# Altium schematic symbol library jlcpcb_2025_04_capacitors_extended_0805.schlib: 3281 symbols (part 14 of 18) (continued)
## GCM21BC71E475ME36L (continued)
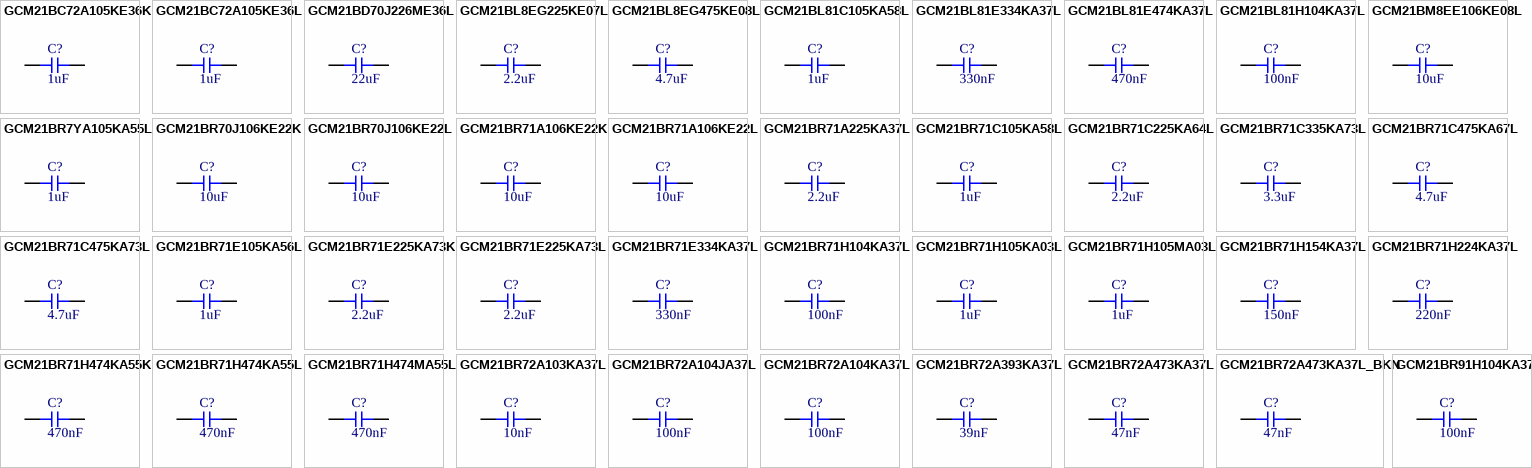
[diagram p62: symbols GCM21BC72A105KE36K to GCM21BR91H104KA37L]

## GCM21BC72A105KE36K
designator C?  Capacitance: 1uF  (hidden comment: *)
Capacitor, Ceramic (MLCC), 1uF, ±10%, 100V, X7S, ±10%, SMD 0805; Manufacturer: Murata Electronics; Manufacturer Part Number: GCM21BC72A105KE36K; Package Size: 0805; JLCPCB Basic Part: No; JLCPCB Part Number: C393696; Supplier 1: LCSC; Category: Capacitors - MLCC; Supplier Part Number 1: C393696; Tolerance: ±10%; Voltage Rating: 100V; Temperature Coefficient: X7S; RoHS: Yes; ComponentLink1Description: Datasheet; ComponentLink1URL: https://wmsc.lcsc.com/wmsc/upload/file/pdf/v2/lcsc/1912111437_Murata-Electronics-GCM21BC72A105KE36K_C393696.pdf; ComponentLink2Description: JLCPCB Part URL; ComponentLink2URL: https://jlcpcb.com/partdetail/C393696; ComponentLink3Description: LCSC Part URL; ComponentLink3URL: https://lcsc.com/product-detail/Multilayer-Ceramic-Capacitors-MLCC---SMD-SMT_Murata-Electronics-Murata-Electronics-GCM21BC72A105KE36K_C393696.html
footprint CAP-0805 (0805 (2012M) Capacitor)
pins: 1, 2

## GCM21BC72A105KE36L
designator C?  Capacitance: 1uF  (hidden comment: *)
Capacitor, Ceramic (MLCC), 1uF, ±10%, 100V, X7S, ±10%, SMD 0805; Manufacturer: Murata Electronics; Manufacturer Part Number: GCM21BC72A105KE36L; Package Size: 0805; JLCPCB Basic Part: No; JLCPCB Part Number: C126585; Supplier 1: LCSC; Category: Capacitors - MLCC; Supplier Part Number 1: C126585; Tolerance: ±10%; Voltage Rating: 100V; Temperature Coefficient: X7S; RoHS: Yes; ComponentLink1Description: Datasheet; ComponentLink1URL: https://wmsc.lcsc.com/wmsc/upload/file/pdf/v2/lcsc/1811141815_Murata-Electronics-GCM21BC72A105KE36L_C126585.pdf; ComponentLink2Description: JLCPCB Part URL; ComponentLink2URL: https://jlcpcb.com/partdetail/C126585; ComponentLink3Description: LCSC Part URL; ComponentLink3URL: https://lcsc.com/product-detail/Multilayer-Ceramic-Capacitors-MLCC---SMD-SMT_Murata-Electronics-Murata-Electronics-GCM21BC72A105KE36L_C126585.html
footprint CAP-0805 (0805 (2012M) Capacitor)
pins: 1, 2

## GCM21BD70J226ME36L
designator C?  Capacitance: 22uF  (hidden comment: *)
Capacitor, Ceramic (MLCC), 22uF, ±20%, 6.3V, X7T, ±20%, SMD 0805; Manufacturer: Murata Electronics; Manufacturer Part Number: GCM21BD70J226ME36L; Package Size: 0805; JLCPCB Basic Part: No; JLCPCB Part Number: C2981736; Supplier 1: LCSC; Category: Capacitors - MLCC; Supplier Part Number 1: C2981736; Tolerance: ±20%; Voltage Rating: 6.3V; Temperature Coefficient: X7T; RoHS: Yes; ComponentLink1Description: Datasheet; ComponentLink1URL: https://wmsc.lcsc.com/wmsc/upload/file/pdf/v2/lcsc/2203210916_Murata-Electronics-GCM21BD70J226ME36L_C2981736.pdf; ComponentLink2Description: JLCPCB Part URL; ComponentLink2URL: https://jlcpcb.com/partdetail/C2981736; ComponentLink3Description: LCSC Part URL; ComponentLink3URL: https://lcsc.com/product-detail/Multilayer-Ceramic-Capacitors-MLCC---SMD-SMT_Murata-Electronics-Murata-Electronics-GCM21BD70J226ME36L_C2981736.html
footprint CAP-0805 (0805 (2012M) Capacitor)
pins: 1, 2

## GCM21BL8EG225KE07L
designator C?  Capacitance: 2.2uF  (hidden comment: *)
Capacitor, Ceramic (MLCC), 2.2uF, ±10%, 35V, X8L, ±10%, SMD 0805; Manufacturer: Murata Electronics; Manufacturer Part Number: GCM21BL8EG225KE07L; Package Size: 0805; JLCPCB Basic Part: No; JLCPCB Part Number: C710702; Supplier 1: LCSC; Category: Capacitors - MLCC; Supplier Part Number 1: C710702; Tolerance: ±10%; Voltage Rating: 35V; Temperature Coefficient: X8L; RoHS: Yes; ComponentLink1Description: Datasheet; ComponentLink1URL: https://wmsc.lcsc.com/wmsc/upload/file/pdf/v2/lcsc/2308111608_Murata-Electronics-GCM21BL8EG225KE07L_C710702.pdf; ComponentLink2Description: JLCPCB Part URL; ComponentLink2URL: https://jlcpcb.com/partdetail/C710702; ComponentLink3Description: LCSC Part URL; ComponentLink3URL: https://lcsc.com/product-detail/Multilayer-Ceramic-Capacitors-MLCC---SMD-SMT_Murata-Electronics-Murata-Electronics-GCM21BL8EG225KE07L_C710702.html
footprint CAP-0805 (0805 (2012M) Capacitor)
pins: 1, 2

## GCM21BL8EG475KE08L
designator C?  Capacitance: 4.7uF  (hidden comment: *)
Capacitor, Ceramic (MLCC), 4.7uF, 35V, X8L, SMD 0805; Manufacturer: Murata Electronics; Manufacturer Part Number: GCM21BL8EG475KE08L; Package Size: 0805; JLCPCB Basic Part: No; JLCPCB Part Number: C2891526; Supplier 1: LCSC; Category: Capacitors - MLCC; Supplier Part Number 1: C2891526; Voltage Rating: 35V; Temperature Coefficient: X8L; RoHS: Yes; ComponentLink1Description: Datasheet; ComponentLink1URL: https://wmsc.lcsc.com/wmsc/upload/file/pdf/v2/lcsc/2201171800_Murata-Electronics-GCM21BL8EG475KE08L_C2891526.pdf; ComponentLink2Description: JLCPCB Part URL; ComponentLink2URL: https://jlcpcb.com/partdetail/C2891526; ComponentLink3Description: LCSC Part URL; ComponentLink3URL: https://lcsc.com/product-detail/Multilayer-Ceramic-Capacitors-MLCC---SMD-SMT_Murata-Electronics-Murata-Electronics-GCM21BL8EG475KE08L_C2891526.html
footprint CAP-0805 (0805 (2012M) Capacitor)
pins: 1, 2

## GCM21BL81C105KA58L
designator C?  Capacitance: 1uF  (hidden comment: *)
Capacitor, Ceramic (MLCC), 1uF, ±10%, 16V, X8L, ±10%, SMD 0805; Manufacturer: Murata Electronics; Manufacturer Part Number: GCM21BL81C105KA58L; Package Size: 0805; JLCPCB Basic Part: No; JLCPCB Part Number: C393690; Supplier 1: LCSC; Category: Capacitors - MLCC; Supplier Part Number 1: C393690; Tolerance: ±10%; Voltage Rating: 16V; Temperature Coefficient: X8L; RoHS: Yes; ComponentLink1Description: Datasheet; ComponentLink1URL: https://wmsc.lcsc.com/wmsc/upload/file/pdf/v2/lcsc/1912111437_Murata-Electronics-GCM21BL81C105KA58L_C393690.pdf; ComponentLink2Description: JLCPCB Part URL; ComponentLink2URL: https://jlcpcb.com/partdetail/C393690; ComponentLink3Description: LCSC Part URL; ComponentLink3URL: https://lcsc.com/product-detail/Multilayer-Ceramic-Capacitors-MLCC---SMD-SMT_Murata-Electronics-Murata-Electronics-GCM21BL81C105KA58L_C393690.html
footprint CAP-0805 (0805 (2012M) Capacitor)
pins: 1, 2

## GCM21BL81E334KA37L
designator C?  Capacitance: 330nF  (hidden comment: *)
Capacitor, Ceramic (MLCC), 330nF, ±10%, 25V, X8L, ±10%, SMD 0805; Manufacturer: Murata Electronics; Manufacturer Part Number: GCM21BL81E334KA37L; Package Size: 0805; JLCPCB Basic Part: No; JLCPCB Part Number: C161258; Supplier 1: LCSC; Category: Capacitors - MLCC; Supplier Part Number 1: C161258; Tolerance: ±10%; Voltage Rating: 25V; Temperature Coefficient: X8L; RoHS: Yes; ComponentLink1Description: Datasheet; ComponentLink1URL: https://wmsc.lcsc.com/wmsc/upload/file/pdf/v2/lcsc/1810201331_Murata-Electronics-GCM21BL81E334KA37L_C161258.pdf; ComponentLink2Description: JLCPCB Part URL; ComponentLink2URL: https://jlcpcb.com/partdetail/C161258; ComponentLink3Description: LCSC Part URL; ComponentLink3URL: https://lcsc.com/product-detail/Multilayer-Ceramic-Capacitors-MLCC---SMD-SMT_Murata-Electronics-Murata-Electronics-GCM21BL81E334KA37L_C161258.html
footprint CAP-0805 (0805 (2012M) Capacitor)
pins: 1, 2

## GCM21BL81E474KA37L
designator C?  Capacitance: 470nF  (hidden comment: *)
Capacitor, Ceramic (MLCC), 470nF, ±10%, 25V, X8L, ±10%, SMD 0805; Manufacturer: Murata Electronics; Manufacturer Part Number: GCM21BL81E474KA37L; Package Size: 0805; JLCPCB Basic Part: No; JLCPCB Part Number: C161259; Supplier 1: LCSC; Category: Capacitors - MLCC; Supplier Part Number 1: C161259; Tolerance: ±10%; Voltage Rating: 25V; Temperature Coefficient: X8L; RoHS: Yes; ComponentLink1Description: Datasheet; ComponentLink1URL: https://wmsc.lcsc.com/wmsc/upload/file/pdf/v2/lcsc/1810201331_Murata-Electronics-GCM21BL81E474KA37L_C161259.pdf; ComponentLink2Description: JLCPCB Part URL; ComponentLink2URL: https://jlcpcb.com/partdetail/C161259; ComponentLink3Description: LCSC Part URL; ComponentLink3URL: https://lcsc.com/product-detail/Multilayer-Ceramic-Capacitors-MLCC---SMD-SMT_Murata-Electronics-Murata-Electronics-GCM21BL81E474KA37L_C161259.html
footprint CAP-0805 (0805 (2012M) Capacitor)
pins: 1, 2

## GCM21BL81H104KA37L
designator C?  Capacitance: 100nF  (hidden comment: *)
Capacitor, Ceramic (MLCC), 100nF, ±10%, 50V, X8L, ±10%, SMD 0805; Manufacturer: Murata Electronics; Manufacturer Part Number: GCM21BL81H104KA37L; Package Size: 0805; JLCPCB Basic Part: No; JLCPCB Part Number: C710699; Supplier 1: LCSC; Category: Capacitors - MLCC; Supplier Part Number 1: C710699; Tolerance: ±10%; Voltage Rating: 50V; Temperature Coefficient: X8L; RoHS: Yes; ComponentLink1Description: Datasheet; ComponentLink1URL: https://wmsc.lcsc.com/wmsc/upload/file/pdf/v2/lcsc/2308111608_Murata-Electronics-GCM21BL81H104KA37L_C710699.pdf; ComponentLink2Description: JLCPCB Part URL; ComponentLink2URL: https://jlcpcb.com/partdetail/C710699; ComponentLink3Description: LCSC Part URL; ComponentLink3URL: https://lcsc.com/product-detail/Multilayer-Ceramic-Capacitors-MLCC---SMD-SMT_Murata-Electronics-Murata-Electronics-GCM21BL81H104KA37L_C710699.html
footprint CAP-0805 (0805 (2012M) Capacitor)
pins: 1, 2

## GCM21BM8EE106KE08L
designator C?  Capacitance: 10uF  (hidden comment: *)
Capacitor, Ceramic (MLCC), 10uF, 16V, X8M, SMD 0805; Manufacturer: Murata Electronics; Manufacturer Part Number: GCM21BM8EE106KE08L; Package Size: 0805; JLCPCB Basic Part: No; JLCPCB Part Number: C3838047; Supplier 1: LCSC; Category: Capacitors - MLCC; Supplier Part Number 1: C3838047; Voltage Rating: 16V; Temperature Coefficient: X8M; RoHS: Yes; ComponentLink1Description: Datasheet; ComponentLink1URL: https://wmsc.lcsc.com/wmsc/upload/file/pdf/v2/lcsc/2207272000_Murata-Electronics-GCM21BM8EE106KE08L_C3838047.pdf; ComponentLink2Description: JLCPCB Part URL; ComponentLink2URL: https://jlcpcb.com/partdetail/C3838047; ComponentLink3Description: LCSC Part URL; ComponentLink3URL: https://lcsc.com/product-detail/Multilayer-Ceramic-Capacitors-MLCC---SMD-SMT_Murata-Electronics-Murata-Electronics-GCM21BM8EE106KE08L_C3838047.html
footprint CAP-0805 (0805 (2012M) Capacitor)
pins: 1, 2

## GCM21BR7YA105KA55L
designator C?  Capacitance: 1uF  (hidden comment: *)
Capacitor, Ceramic (MLCC), 1uF, ±10%, 35V, X7R, ±10%, SMD 0805; Manufacturer: Murata Electronics; Manufacturer Part Number: GCM21BR7YA105KA55L; Package Size: 0805; JLCPCB Basic Part: No; JLCPCB Part Number: C161268; Supplier 1: LCSC; Category: Capacitors - MLCC; Supplier Part Number 1: C161268; Tolerance: ±10%; Voltage Rating: 35V; Temperature Coefficient: X7R; RoHS: Yes; ComponentLink1Description: Datasheet; ComponentLink1URL: https://wmsc.lcsc.com/wmsc/upload/file/pdf/v2/lcsc/1810201316_Murata-Electronics-GCM21BR7YA105KA55L_C161268.pdf; ComponentLink2Description: JLCPCB Part URL; ComponentLink2URL: https://jlcpcb.com/partdetail/C161268; ComponentLink3Description: LCSC Part URL; ComponentLink3URL: https://lcsc.com/product-detail/Multilayer-Ceramic-Capacitors-MLCC---SMD-SMT_Murata-Electronics-Murata-Electronics-GCM21BR7YA105KA55L_C161268.html
footprint CAP-0805 (0805 (2012M) Capacitor)
pins: 1, 2

## GCM21BR70J106KE22K
designator C?  Capacitance: 10uF  (hidden comment: *)
Capacitor, Ceramic (MLCC), 10uF, ±10%, 6.3V, X7R, ±10%, SMD 0805; Manufacturer: Murata Electronics; Manufacturer Part Number: GCM21BR70J106KE22K; Package Size: 0805; JLCPCB Basic Part: No; JLCPCB Part Number: C2167712; Supplier 1: LCSC; Category: Capacitors - MLCC; Supplier Part Number 1: C2167712; Tolerance: ±10%; Voltage Rating: 6.3V; Temperature Coefficient: X7R; RoHS: Yes; ComponentLink1Description: Datasheet; ComponentLink1URL: https://wmsc.lcsc.com/wmsc/upload/file/pdf/v2/lcsc/2202040230_Murata-Electronics-GCM21BR70J106KE22K_C2167712.pdf; ComponentLink2Description: JLCPCB Part URL; ComponentLink2URL: https://jlcpcb.com/partdetail/C2167712; ComponentLink3Description: LCSC Part URL; ComponentLink3URL: https://lcsc.com/product-detail/Multilayer-Ceramic-Capacitors-MLCC---SMD-SMT_Murata-Electronics-Murata-Electronics-GCM21BR70J106KE22K_C2167712.html
footprint CAP-0805 (0805 (2012M) Capacitor)
pins: 1, 2

## GCM21BR70J106KE22L
designator C?  Capacitance: 10uF  (hidden comment: *)
Capacitor, Ceramic (MLCC), 10uF, ±10%, 6.3V, X7R, ±10%, SMD 0805; Manufacturer: Murata Electronics; Manufacturer Part Number: GCM21BR70J106KE22L; Package Size: 0805; JLCPCB Basic Part: No; JLCPCB Part Number: C126230; Supplier 1: LCSC; Category: Capacitors - MLCC; Supplier Part Number 1: C126230; Tolerance: ±10%; Voltage Rating: 6.3V; Temperature Coefficient: X7R; RoHS: Yes; ComponentLink1Description: Datasheet; ComponentLink1URL: https://wmsc.lcsc.com/wmsc/upload/file/pdf/v2/lcsc/1810201231_Murata-Electronics-GCM21BR70J106KE22L_C126230.pdf; ComponentLink2Description: JLCPCB Part URL; ComponentLink2URL: https://jlcpcb.com/partdetail/C126230; ComponentLink3Description: LCSC Part URL; ComponentLink3URL: https://lcsc.com/product-detail/Multilayer-Ceramic-Capacitors-MLCC---SMD-SMT_Murata-Electronics-Murata-Electronics-GCM21BR70J106KE22L_C126230.html
footprint CAP-0805 (0805 (2012M) Capacitor)
pins: 1, 2

## GCM21BR71A106KE22K
designator C?  Capacitance: 10uF  (hidden comment: *)
Capacitor, Ceramic (MLCC), 10uF, ±10%, 10V, X7R, ±10%, SMD 0805; Manufacturer: Murata Electronics; Manufacturer Part Number: GCM21BR71A106KE22K; Package Size: 0805; JLCPCB Basic Part: No; JLCPCB Part Number: C2167756; Supplier 1: LCSC; Category: Capacitors - MLCC; Supplier Part Number 1: C2167756; Tolerance: ±10%; Voltage Rating: 10V; Temperature Coefficient: X7R; RoHS: Yes; ComponentLink1Description: Datasheet; ComponentLink1URL: https://wmsc.lcsc.com/wmsc/upload/file/pdf/v2/lcsc/2202040230_Murata-Electronics-GCM21BR71A106KE22K_C2167756.pdf; ComponentLink2Description: JLCPCB Part URL; ComponentLink2URL: https://jlcpcb.com/partdetail/C2167756; ComponentLink3Description: LCSC Part URL; ComponentLink3URL: https://lcsc.com/product-detail/Multilayer-Ceramic-Capacitors-MLCC---SMD-SMT_Murata-Electronics-Murata-Electronics-GCM21BR71A106KE22K_C2167756.html
footprint CAP-0805 (0805 (2012M) Capacitor)
pins: 1, 2

## GCM21BR71A106KE22L
designator C?  Capacitance: 10uF  (hidden comment: *)
Capacitor, Ceramic (MLCC), 10uF, ±10%, 10V, X7R, ±10%, SMD 0805; Manufacturer: Murata Electronics; Manufacturer Part Number: GCM21BR71A106KE22L; Package Size: 0805; JLCPCB Basic Part: No; JLCPCB Part Number: C126586; Supplier 1: LCSC; Category: Capacitors - MLCC; Supplier Part Number 1: C126586; Tolerance: ±10%; Voltage Rating: 10V; Temperature Coefficient: X7R; RoHS: Yes; ComponentLink1Description: Datasheet; ComponentLink1URL: https://wmsc.lcsc.com/wmsc/upload/file/pdf/v2/lcsc/1810201230_Murata-Electronics-GCM21BR71A106KE22L_C126586.pdf; ComponentLink2Description: JLCPCB Part URL; ComponentLink2URL: https://jlcpcb.com/partdetail/C126586; ComponentLink3Description: LCSC Part URL; ComponentLink3URL: https://lcsc.com/product-detail/Multilayer-Ceramic-Capacitors-MLCC---SMD-SMT_Murata-Electronics-Murata-Electronics-GCM21BR71A106KE22L_C126586.html
footprint CAP-0805 (0805 (2012M) Capacitor)
pins: 1, 2

## GCM21BR71A225KA37L
designator C?  Capacitance: 2.2uF  (hidden comment: *)
Capacitor, Ceramic (MLCC), 2.2uF, ±10%, 10V, X7R, ±10%, SMD 0805; Manufacturer: Murata Electronics; Manufacturer Part Number: GCM21BR71A225KA37L; Package Size: 0805; JLCPCB Basic Part: No; JLCPCB Part Number: C126587; Supplier 1: LCSC; Category: Capacitors - MLCC; Supplier Part Number 1: C126587; Tolerance: ±10%; Voltage Rating: 10V; Temperature Coefficient: X7R; RoHS: Yes; ComponentLink1Description: Datasheet; ComponentLink1URL: https://wmsc.lcsc.com/wmsc/upload/file/pdf/v2/lcsc/1811021110_Murata-Electronics-GCM21BR71A225KA37L_C126587.pdf; ComponentLink2Description: JLCPCB Part URL; ComponentLink2URL: https://jlcpcb.com/partdetail/C126587; ComponentLink3Description: LCSC Part URL; ComponentLink3URL: https://lcsc.com/product-detail/Multilayer-Ceramic-Capacitors-MLCC---SMD-SMT_Murata-Electronics-Murata-Electronics-GCM21BR71A225KA37L_C126587.html
footprint CAP-0805 (0805 (2012M) Capacitor)
pins: 1, 2

## GCM21BR71C105KA58L
designator C?  Capacitance: 1uF  (hidden comment: *)
Capacitor, Ceramic (MLCC), 1uF, ±10%, 16V, X7R, ±10%, SMD 0805; Manufacturer: Murata Electronics; Manufacturer Part Number: GCM21BR71C105KA58L; Package Size: 0805; JLCPCB Basic Part: No; JLCPCB Part Number: C126588; Supplier 1: LCSC; Category: Capacitors - MLCC; Supplier Part Number 1: C126588; Tolerance: ±10%; Voltage Rating: 16V; Temperature Coefficient: X7R; RoHS: Yes; ComponentLink1Description: Datasheet; ComponentLink1URL: https://wmsc.lcsc.com/wmsc/upload/file/pdf/v2/lcsc/1912111437_Murata-Electronics-GCM21BR71C105KA58L_C126588.pdf; ComponentLink2Description: JLCPCB Part URL; ComponentLink2URL: https://jlcpcb.com/partdetail/C126588; ComponentLink3Description: LCSC Part URL; ComponentLink3URL: https://lcsc.com/product-detail/Multilayer-Ceramic-Capacitors-MLCC---SMD-SMT_Murata-Electronics-Murata-Electronics-GCM21BR71C105KA58L_C126588.html
footprint CAP-0805 (0805 (2012M) Capacitor)
pins: 1, 2

## GCM21BR71C225KA64L
designator C?  Capacitance: 2.2uF  (hidden comment: *)
Capacitor, Ceramic (MLCC), 2.2uF, ±10%, 16V, X7R, ±10%, SMD 0805; Manufacturer: Murata Electronics; Manufacturer Part Number: GCM21BR71C225KA64L; Package Size: 0805; JLCPCB Basic Part: No; JLCPCB Part Number: C126589; Supplier 1: LCSC; Category: Capacitors - MLCC; Supplier Part Number 1: C126589; Tolerance: ±10%; Voltage Rating: 16V; Temperature Coefficient: X7R; RoHS: Yes; ComponentLink1Description: Datasheet; ComponentLink1URL: https://wmsc.lcsc.com/wmsc/upload/file/pdf/v2/lcsc/1810201231_Murata-Electronics-GCM21BR71C225KA64L_C126589.pdf; ComponentLink2Description: JLCPCB Part URL; ComponentLink2URL: https://jlcpcb.com/partdetail/C126589; ComponentLink3Description: LCSC Part URL; ComponentLink3URL: https://lcsc.com/product-detail/Multilayer-Ceramic-Capacitors-MLCC---SMD-SMT_Murata-Electronics-Murata-Electronics-GCM21BR71C225KA64L_C126589.html
footprint CAP-0805 (0805 (2012M) Capacitor)
pins: 1, 2

## GCM21BR71C335KA73L
designator C?  Capacitance: 3.3uF  (hidden comment: *)
Capacitor, Ceramic (MLCC), 3.3uF, ±10%, 16V, X7R, ±10%, SMD 0805; Manufacturer: Murata Electronics; Manufacturer Part Number: GCM21BR71C335KA73L; Package Size: 0805; JLCPCB Basic Part: No; JLCPCB Part Number: C354351; Supplier 1: LCSC; Category: Capacitors - MLCC; Supplier Part Number 1: C354351; Tolerance: ±10%; Voltage Rating: 16V; Temperature Coefficient: X7R; RoHS: Yes; ComponentLink1Description: Datasheet; ComponentLink1URL: https://wmsc.lcsc.com/wmsc/upload/file/pdf/v2/lcsc/2304140030_Murata-Electronics-GCM21BR71C335KA73L_C354351.pdf; ComponentLink2Description: JLCPCB Part URL; ComponentLink2URL: https://jlcpcb.com/partdetail/C354351; ComponentLink3Description: LCSC Part URL; ComponentLink3URL: https://lcsc.com/product-detail/Multilayer-Ceramic-Capacitors-MLCC---SMD-SMT_Murata-Electronics-Murata-Electronics-GCM21BR71C335KA73L_C354351.html
footprint CAP-0805 (0805 (2012M) Capacitor)
pins: 1, 2

## GCM21BR71C475KA67L
designator C?  Capacitance: 4.7uF  (hidden comment: *)
Capacitor, Ceramic (MLCC), 4.7uF, ±10%, 16V, X7R, ±10%, SMD 0805; Manufacturer: Murata Electronics; Manufacturer Part Number: GCM21BR71C475KA67L; Package Size: 0805; JLCPCB Basic Part: No; JLCPCB Part Number: C126590; Supplier 1: LCSC; Category: Capacitors - MLCC; Supplier Part Number 1: C126590; Tolerance: ±10%; Voltage Rating: 16V; Temperature Coefficient: X7R; RoHS: Yes; ComponentLink1Description: Datasheet; ComponentLink1URL: https://wmsc.lcsc.com/wmsc/upload/file/pdf/v2/lcsc/2304140030_Murata-Electronics-GCM21BR71C475KA67L_C126590.pdf; ComponentLink2Description: JLCPCB Part URL; ComponentLink2URL: https://jlcpcb.com/partdetail/C126590; ComponentLink3Description: LCSC Part URL; ComponentLink3URL: https://lcsc.com/product-detail/Multilayer-Ceramic-Capacitors-MLCC---SMD-SMT_Murata-Electronics-Murata-Electronics-GCM21BR71C475KA67L_C126590.html
footprint CAP-0805 (0805 (2012M) Capacitor)
pins: 1, 2

## GCM21BR71C475KA73L
designator C?  Capacitance: 4.7uF  (hidden comment: *)
Capacitor, Ceramic (MLCC), 4.7uF, ±10%, 16V, X7R, ±10%, SMD 0805; Manufacturer: Murata Electronics; Manufacturer Part Number: GCM21BR71C475KA73L; Package Size: 0805; JLCPCB Basic Part: No; JLCPCB Part Number: C90791; Supplier 1: LCSC; Category: Capacitors - MLCC; Supplier Part Number 1: C90791; Tolerance: ±10%; Voltage Rating: 16V; Temperature Coefficient: X7R; RoHS: Yes; ComponentLink1Description: Datasheet; ComponentLink1URL: https://wmsc.lcsc.com/wmsc/upload/file/pdf/v2/lcsc/1810201242_Murata-Electronics-GCM21BR71C475KA73L_C90791.pdf; ComponentLink2Description: JLCPCB Part URL; ComponentLink2URL: https://jlcpcb.com/partdetail/C90791; ComponentLink3Description: LCSC Part URL; ComponentLink3URL: https://lcsc.com/product-detail/Multilayer-Ceramic-Capacitors-MLCC---SMD-SMT_Murata-Electronics-Murata-Electronics-GCM21BR71C475KA73L_C90791.html
footprint CAP-0805 (0805 (2012M) Capacitor)
pins: 1, 2

## GCM21BR71E105KA56L
designator C?  Capacitance: 1uF  (hidden comment: *)
Capacitor, Ceramic (MLCC), 1uF, ±10%, 25V, X7R, ±10%, SMD 0805; Manufacturer: Murata Electronics; Manufacturer Part Number: GCM21BR71E105KA56L; Package Size: 0805; JLCPCB Basic Part: No; JLCPCB Part Number: C85865; Supplier 1: LCSC; Category: Capacitors - MLCC; Supplier Part Number 1: C85865; Tolerance: ±10%; Voltage Rating: 25V; Temperature Coefficient: X7R; RoHS: Yes; ComponentLink1Description: Datasheet; ComponentLink1URL: https://wmsc.lcsc.com/wmsc/upload/file/pdf/v2/lcsc/2304140030_Murata-Electronics-GCM21BR71E105KA56L_C85865.pdf; ComponentLink2Description: JLCPCB Part URL; ComponentLink2URL: https://jlcpcb.com/partdetail/C85865; ComponentLink3Description: LCSC Part URL; ComponentLink3URL: https://lcsc.com/product-detail/Multilayer-Ceramic-Capacitors-MLCC---SMD-SMT_Murata-Electronics-Murata-Electronics-GCM21BR71E105KA56L_C85865.html
footprint CAP-0805 (0805 (2012M) Capacitor)
pins: 1, 2

## GCM21BR71E225KA73K
designator C?  Capacitance: 2.2uF  (hidden comment: *)
Capacitor, Ceramic (MLCC), 2.2uF, ±10%, 25V, X7R, ±10%, SMD 0805; Manufacturer: Murata Electronics; Manufacturer Part Number: GCM21BR71E225KA73K; Package Size: 0805; JLCPCB Basic Part: No; JLCPCB Part Number: C2167975; Supplier 1: LCSC; Category: Capacitors - MLCC; Supplier Part Number 1: C2167975; Tolerance: ±10%; Voltage Rating: 25V; Temperature Coefficient: X7R; RoHS: Yes; ComponentLink1Description: Datasheet; ComponentLink1URL: https://wmsc.lcsc.com/wmsc/upload/file/pdf/v2/lcsc/2202040300_Murata-Electronics-GCM21BR71E225KA73K_C2167975.pdf; ComponentLink2Description: JLCPCB Part URL; ComponentLink2URL: https://jlcpcb.com/partdetail/C2167975; ComponentLink3Description: LCSC Part URL; ComponentLink3URL: https://lcsc.com/product-detail/Multilayer-Ceramic-Capacitors-MLCC---SMD-SMT_Murata-Electronics-Murata-Electronics-GCM21BR71E225KA73K_C2167975.html
footprint CAP-0805 (0805 (2012M) Capacitor)
pins: 1, 2

## GCM21BR71E225KA73L
designator C?  Capacitance: 2.2uF  (hidden comment: *)
Capacitor, Ceramic (MLCC), 2.2uF, ±10%, 25V, X7R, ±10%, SMD 0805; Manufacturer: Murata Electronics; Manufacturer Part Number: GCM21BR71E225KA73L; Package Size: 0805; JLCPCB Basic Part: No; JLCPCB Part Number: C126591; Supplier 1: LCSC; Category: Capacitors - MLCC; Supplier Part Number 1: C126591; Tolerance: ±10%; Voltage Rating: 25V; Temperature Coefficient: X7R; RoHS: Yes; ComponentLink1Description: Datasheet; ComponentLink1URL: https://wmsc.lcsc.com/wmsc/upload/file/pdf/v2/lcsc/1810201230_Murata-Electronics-GCM21BR71E225KA73L_C126591.pdf; ComponentLink2Description: JLCPCB Part URL; ComponentLink2URL: https://jlcpcb.com/partdetail/C126591; ComponentLink3Description: LCSC Part URL; ComponentLink3URL: https://lcsc.com/product-detail/Multilayer-Ceramic-Capacitors-MLCC---SMD-SMT_Murata-Electronics-Murata-Electronics-GCM21BR71E225KA73L_C126591.html
footprint CAP-0805 (0805 (2012M) Capacitor)
pins: 1, 2

## GCM21BR71E334KA37L
designator C?  Capacitance: 330nF  (hidden comment: *)
Capacitor, Ceramic (MLCC), 330nF, ±10%, ±10%, SMD 0805; Manufacturer: Murata Electronics; Manufacturer Part Number: GCM21BR71E334KA37L; Package Size: 0805; JLCPCB Basic Part: No; JLCPCB Part Number: C782044; Supplier 1: LCSC; Category: Capacitors - MLCC; Supplier Part Number 1: C782044; Tolerance: ±10%; RoHS: Yes; ComponentLink1Description: Datasheet; ComponentLink1URL: https://wmsc.lcsc.com/wmsc/upload/file/pdf/v2/lcsc/2304140030_Murata-Electronics-GCM21BR71E334KA37L_C782044.pdf; ComponentLink2Description: JLCPCB Part URL; ComponentLink2URL: https://jlcpcb.com/partdetail/C782044; ComponentLink3Description: LCSC Part URL; ComponentLink3URL: https://lcsc.com/product-detail/Multilayer-Ceramic-Capacitors-MLCC---SMD-SMT_Murata-Electronics-Murata-Electronics-GCM21BR71E334KA37L_C782044.html
footprint CAP-0805 (0805 (2012M) Capacitor)
pins: 1, 2

## GCM21BR71H104KA37L
designator C?  Capacitance: 100nF  (hidden comment: *)
Capacitor, Ceramic (MLCC), 100nF, ±10%, 50V, X7R, ±10%, SMD 0805; Manufacturer: Murata Electronics; Manufacturer Part Number: GCM21BR71H104KA37L; Package Size: 0805; JLCPCB Basic Part: No; JLCPCB Part Number: C161260; Supplier 1: LCSC; Category: Capacitors - MLCC; Supplier Part Number 1: C161260; Tolerance: ±10%; Voltage Rating: 50V; Temperature Coefficient: X7R; RoHS: Yes; ComponentLink1Description: Datasheet; ComponentLink1URL: https://wmsc.lcsc.com/wmsc/upload/file/pdf/v2/lcsc/1811142021_Murata-Electronics-GCM21BR71H104KA37L_C161260.pdf; ComponentLink2Description: JLCPCB Part URL; ComponentLink2URL: https://jlcpcb.com/partdetail/C161260; ComponentLink3Description: LCSC Part URL; ComponentLink3URL: https://lcsc.com/product-detail/Multilayer-Ceramic-Capacitors-MLCC---SMD-SMT_Murata-Electronics-Murata-Electronics-GCM21BR71H104KA37L_C161260.html
footprint CAP-0805 (0805 (2012M) Capacitor)
pins: 1, 2

## GCM21BR71H105KA03L
designator C?  Capacitance: 1uF  (hidden comment: *)
Capacitor, Ceramic (MLCC), 1uF, ±10%, 50V, X7R, ±10%, SMD 0805; Manufacturer: Murata Electronics; Manufacturer Part Number: GCM21BR71H105KA03L; Package Size: 0805; JLCPCB Basic Part: No; JLCPCB Part Number: C126592; Supplier 1: LCSC; Category: Capacitors - MLCC; Supplier Part Number 1: C126592; Tolerance: ±10%; Voltage Rating: 50V; Temperature Coefficient: X7R; RoHS: Yes; ComponentLink1Description: Datasheet; ComponentLink1URL: https://wmsc.lcsc.com/wmsc/upload/file/pdf/v2/lcsc/1811141813_Murata-Electronics-GCM21BR71H105KA03L_C126592.pdf; ComponentLink2Description: JLCPCB Part URL; ComponentLink2URL: https://jlcpcb.com/partdetail/C126592; ComponentLink3Description: LCSC Part URL; ComponentLink3URL: https://lcsc.com/product-detail/Multilayer-Ceramic-Capacitors-MLCC---SMD-SMT_Murata-Electronics-Murata-Electronics-GCM21BR71H105KA03L_C126592.html
footprint CAP-0805 (0805 (2012M) Capacitor)
pins: 1, 2

## GCM21BR71H105MA03L
designator C?  Capacitance: 1uF  (hidden comment: *)
Capacitor, Ceramic (MLCC), 1uF, ±20%, null, X7R, ±20%, SMD 0805; Manufacturer: Murata Electronics; Manufacturer Part Number: GCM21BR71H105MA03L; Package Size: 0805; JLCPCB Basic Part: No; JLCPCB Part Number: C782045; Supplier 1: LCSC; Category: Capacitors - MLCC; Supplier Part Number 1: C782045; Tolerance: ±20%; Voltage Rating: null; Temperature Coefficient: X7R; RoHS: Yes; ComponentLink1Description: Datasheet; ComponentLink1URL: https://wmsc.lcsc.com/wmsc/upload/file/pdf/v2/lcsc/2009161209_Murata-Electronics-GCM21BR71H105MA03L_C782045.pdf; ComponentLink2Description: JLCPCB Part URL; ComponentLink2URL: https://jlcpcb.com/partdetail/C782045; ComponentLink3Description: LCSC Part URL; ComponentLink3URL: https://lcsc.com/product-detail/Multilayer-Ceramic-Capacitors-MLCC---SMD-SMT_Murata-Electronics-Murata-Electronics-GCM21BR71H105MA03L_C782045.html
footprint CAP-0805 (0805 (2012M) Capacitor)
pins: 1, 2

## GCM21BR71H154KA37L
designator C?  Capacitance: 150nF  (hidden comment: *)
Capacitor, Ceramic (MLCC), 150nF, ±10%, 50V, X7R, ±10%, SMD 0805; Manufacturer: Murata Electronics; Manufacturer Part Number: GCM21BR71H154KA37L; Package Size: 0805; JLCPCB Basic Part: No; JLCPCB Part Number: C408124; Supplier 1: LCSC; Category: Capacitors - MLCC; Supplier Part Number 1: C408124; Tolerance: ±10%; Voltage Rating: 50V; Temperature Coefficient: X7R; RoHS: Yes; ComponentLink1Description: Datasheet; ComponentLink1URL: https://wmsc.lcsc.com/wmsc/upload/file/pdf/v2/lcsc/2304140030_Murata-Electronics-GCM21BR71H154KA37L_C408124.pdf; ComponentLink2Description: JLCPCB Part URL; ComponentLink2URL: https://jlcpcb.com/partdetail/C408124; ComponentLink3Description: LCSC Part URL; ComponentLink3URL: https://lcsc.com/product-detail/Multilayer-Ceramic-Capacitors-MLCC---SMD-SMT_Murata-Electronics-Murata-Electronics-GCM21BR71H154KA37L_C408124.html
footprint CAP-0805 (0805 (2012M) Capacitor)
pins: 1, 2

## GCM21BR71H224KA37L
designator C?  Capacitance: 220nF  (hidden comment: *)
Capacitor, Ceramic (MLCC), 220nF, ±10%, 50V, X7R, ±10%, SMD 0805; Manufacturer: Murata Electronics; Manufacturer Part Number: GCM21BR71H224KA37L; Package Size: 0805; JLCPCB Basic Part: No; JLCPCB Part Number: C161262; Supplier 1: LCSC; Category: Capacitors - MLCC; Supplier Part Number 1: C161262; Tolerance: ±10%; Voltage Rating: 50V; Temperature Coefficient: X7R; RoHS: Yes; ComponentLink1Description: Datasheet; ComponentLink1URL: https://wmsc.lcsc.com/wmsc/upload/file/pdf/v2/lcsc/1810201331_Murata-Electronics-GCM21BR71H224KA37L_C161262.pdf; ComponentLink2Description: JLCPCB Part URL; ComponentLink2URL: https://jlcpcb.com/partdetail/C161262; ComponentLink3Description: LCSC Part URL; ComponentLink3URL: https://lcsc.com/product-detail/Multilayer-Ceramic-Capacitors-MLCC---SMD-SMT_Murata-Electronics-Murata-Electronics-GCM21BR71H224KA37L_C161262.html
footprint CAP-0805 (0805 (2012M) Capacitor)
pins: 1, 2

## GCM21BR71H474KA55K
designator C?  Capacitance: 470nF  (hidden comment: *)
Capacitor, Ceramic (MLCC), 470nF, ±10%, 50V, X7R, ±10%, SMD 0805; Manufacturer: Murata Electronics; Manufacturer Part Number: GCM21BR71H474KA55K; Package Size: 0805; JLCPCB Basic Part: No; JLCPCB Part Number: C2177863; Supplier 1: LCSC; Category: Capacitors - MLCC; Supplier Part Number 1: C2177863; Tolerance: ±10%; Voltage Rating: 50V; Temperature Coefficient: X7R; RoHS: Yes; ComponentLink1Description: Datasheet; ComponentLink1URL: https://wmsc.lcsc.com/wmsc/upload/file/pdf/v2/lcsc/2308111608_Murata-Electronics-GCM21BR71H474KA55K_C2177863.pdf; ComponentLink2Description: JLCPCB Part URL; ComponentLink2URL: https://jlcpcb.com/partdetail/C2177863; ComponentLink3Description: LCSC Part URL; ComponentLink3URL: https://lcsc.com/product-detail/Multilayer-Ceramic-Capacitors-MLCC---SMD-SMT_Murata-Electronics-Murata-Electronics-GCM21BR71H474KA55K_C2177863.html
footprint CAP-0805 (0805 (2012M) Capacitor)
pins: 1, 2

## GCM21BR71H474KA55L
designator C?  Capacitance: 470nF  (hidden comment: *)
Capacitor, Ceramic (MLCC), 470nF, ±10%, 50V, X7R, ±10%, SMD 0805; Manufacturer: Murata Electronics; Manufacturer Part Number: GCM21BR71H474KA55L; Package Size: 0805; JLCPCB Basic Part: No; JLCPCB Part Number: C161263; Supplier 1: LCSC; Category: Capacitors - MLCC; Supplier Part Number 1: C161263; Tolerance: ±10%; Voltage Rating: 50V; Temperature Coefficient: X7R; RoHS: Yes; ComponentLink1Description: Datasheet; ComponentLink1URL: https://wmsc.lcsc.com/wmsc/upload/file/pdf/v2/lcsc/1810201240_Murata-Electronics-GCM21BR71H474KA55L_C161263.pdf; ComponentLink2Description: JLCPCB Part URL; ComponentLink2URL: https://jlcpcb.com/partdetail/C161263; ComponentLink3Description: LCSC Part URL; ComponentLink3URL: https://lcsc.com/product-detail/Multilayer-Ceramic-Capacitors-MLCC---SMD-SMT_Murata-Electronics-Murata-Electronics-GCM21BR71H474KA55L_C161263.html
footprint CAP-0805 (0805 (2012M) Capacitor)
pins: 1, 2

## GCM21BR71H474MA55L
designator C?  Capacitance: 470nF  (hidden comment: *)
Capacitor, Ceramic (MLCC), 470nF, ±20%, 50V, X7R, ±20%, SMD 0805; Manufacturer: Murata Electronics; Manufacturer Part Number: GCM21BR71H474MA55L; Package Size: 0805; JLCPCB Basic Part: No; JLCPCB Part Number: C161264; Supplier 1: LCSC; Category: Capacitors - MLCC; Supplier Part Number 1: C161264; Tolerance: ±20%; Voltage Rating: 50V; Temperature Coefficient: X7R; RoHS: Yes; ComponentLink1Description: Datasheet; ComponentLink1URL: https://wmsc.lcsc.com/wmsc/upload/file/pdf/v2/lcsc/1810201331_Murata-Electronics-GCM21BR71H474MA55L_C161264.pdf; ComponentLink2Description: JLCPCB Part URL; ComponentLink2URL: https://jlcpcb.com/partdetail/C161264; ComponentLink3Description: LCSC Part URL; ComponentLink3URL: https://lcsc.com/product-detail/Multilayer-Ceramic-Capacitors-MLCC---SMD-SMT_Murata-Electronics-Murata-Electronics-GCM21BR71H474MA55L_C161264.html
footprint CAP-0805 (0805 (2012M) Capacitor)
pins: 1, 2

## GCM21BR72A103KA37L
designator C?  Capacitance: 10nF  (hidden comment: *)
Capacitor, Ceramic (MLCC), 10nF, ±10%, 100V, X7R, ±10%, SMD 0805; Manufacturer: Murata Electronics; Manufacturer Part Number: GCM21BR72A103KA37L; Package Size: 0805; JLCPCB Basic Part: No; JLCPCB Part Number: C161265; Supplier 1: LCSC; Category: Capacitors - MLCC; Supplier Part Number 1: C161265; Tolerance: ±10%; Voltage Rating: 100V; Temperature Coefficient: X7R; RoHS: Yes; ComponentLink1Description: Datasheet; ComponentLink1URL: https://wmsc.lcsc.com/wmsc/upload/file/pdf/v2/lcsc/1810201331_Murata-Electronics-GCM21BR72A103KA37L_C161265.pdf; ComponentLink2Description: JLCPCB Part URL; ComponentLink2URL: https://jlcpcb.com/partdetail/C161265; ComponentLink3Description: LCSC Part URL; ComponentLink3URL: https://lcsc.com/product-detail/Multilayer-Ceramic-Capacitors-MLCC---SMD-SMT_Murata-Electronics-Murata-Electronics-GCM21BR72A103KA37L_C161265.html
footprint CAP-0805 (0805 (2012M) Capacitor)
pins: 1, 2

## GCM21BR72A104JA37L
designator C?  Capacitance: 100nF  (hidden comment: *)
Capacitor, Ceramic (MLCC), 100nF, ±5%, 100V, X7R, ±5%, SMD 0805; Manufacturer: Murata Electronics; Manufacturer Part Number: GCM21BR72A104JA37L; Package Size: 0805; JLCPCB Basic Part: No; JLCPCB Part Number: C361057; Supplier 1: LCSC; Category: Capacitors - MLCC; Supplier Part Number 1: C361057; Tolerance: ±5%; Voltage Rating: 100V; Temperature Coefficient: X7R; RoHS: Yes; ComponentLink1Description: Datasheet; ComponentLink1URL: https://wmsc.lcsc.com/wmsc/upload/file/pdf/v2/lcsc/2304140030_Murata-Electronics-GCM21BR72A104JA37L_C361057.pdf; ComponentLink2Description: JLCPCB Part URL; ComponentLink2URL: https://jlcpcb.com/partdetail/C361057; ComponentLink3Description: LCSC Part URL; ComponentLink3URL: https://lcsc.com/product-detail/Multilayer-Ceramic-Capacitors-MLCC---SMD-SMT_Murata-Electronics-Murata-Electronics-GCM21BR72A104JA37L_C361057.html
footprint CAP-0805 (0805 (2012M) Capacitor)
pins: 1, 2

## GCM21BR72A104KA37L
designator C?  Capacitance: 100nF  (hidden comment: *)
Capacitor, Ceramic (MLCC), 100nF, ±10%, 100V, X7R, ±10%, SMD 0805; Manufacturer: Murata Electronics; Manufacturer Part Number: GCM21BR72A104KA37L; Package Size: 0805; JLCPCB Basic Part: No; JLCPCB Part Number: C85866; Supplier 1: LCSC; Category: Capacitors - MLCC; Supplier Part Number 1: C85866; Tolerance: ±10%; Voltage Rating: 100V; Temperature Coefficient: X7R; RoHS: Yes; ComponentLink1Description: Datasheet; ComponentLink1URL: https://wmsc.lcsc.com/wmsc/upload/file/pdf/v2/lcsc/2304140030_Murata-Electronics-GCM21BR72A104KA37L_C85866.pdf; ComponentLink2Description: JLCPCB Part URL; ComponentLink2URL: https://jlcpcb.com/partdetail/C85866; ComponentLink3Description: LCSC Part URL; ComponentLink3URL: https://lcsc.com/product-detail/Multilayer-Ceramic-Capacitors-MLCC---SMD-SMT_Murata-Electronics-Murata-Electronics-GCM21BR72A104KA37L_C85866.html
footprint CAP-0805 (0805 (2012M) Capacitor)
pins: 1, 2

## GCM21BR72A393KA37L
designator C?  Capacitance: 39nF  (hidden comment: *)
Capacitor, Ceramic (MLCC), 39nF, ±10%, 100V, X7R, ±10%, SMD 0805; Manufacturer: Murata Electronics; Manufacturer Part Number: GCM21BR72A393KA37L; Package Size: 0805; JLCPCB Basic Part: No; JLCPCB Part Number: C913436; Supplier 1: LCSC; Category: Capacitors - MLCC; Supplier Part Number 1: C913436; Tolerance: ±10%; Voltage Rating: 100V; Temperature Coefficient: X7R; RoHS: Yes; ComponentLink1Description: Datasheet; ComponentLink1URL: https://wmsc.lcsc.com/wmsc/upload/file/pdf/v2/lcsc/2304140030_Murata-Electronics-GCM21BR72A393KA37L_C913436.pdf; ComponentLink2Description: JLCPCB Part URL; ComponentLink2URL: https://jlcpcb.com/partdetail/C913436; ComponentLink3Description: LCSC Part URL; ComponentLink3URL: https://lcsc.com/product-detail/Multilayer-Ceramic-Capacitors-MLCC---SMD-SMT_Murata-Electronics-Murata-Electronics-GCM21BR72A393KA37L_C913436.html
footprint CAP-0805 (0805 (2012M) Capacitor)
pins: 1, 2

## GCM21BR72A473KA37L
designator C?  Capacitance: 47nF  (hidden comment: *)
Capacitor, Ceramic (MLCC), 47nF, ±10%, 100V, X7R, ±10%, SMD 0805; Manufacturer: Murata Electronics; Manufacturer Part Number: GCM21BR72A473KA37L; Package Size: 0805; JLCPCB Basic Part: No; JLCPCB Part Number: C161267; Supplier 1: LCSC; Category: Capacitors - MLCC; Supplier Part Number 1: C161267; Tolerance: ±10%; Voltage Rating: 100V; Temperature Coefficient: X7R; RoHS: Yes; ComponentLink1Description: Datasheet; ComponentLink1URL: https://wmsc.lcsc.com/wmsc/upload/file/pdf/v2/lcsc/1810201331_Murata-Electronics-GCM21BR72A473KA37L_C161267.pdf; ComponentLink2Description: JLCPCB Part URL; ComponentLink2URL: https://jlcpcb.com/partdetail/C161267; ComponentLink3Description: LCSC Part URL; ComponentLink3URL: https://lcsc.com/product-detail/Multilayer-Ceramic-Capacitors-MLCC---SMD-SMT_Murata-Electronics-Murata-Electronics-GCM21BR72A473KA37L_C161267.html
footprint CAP-0805 (0805 (2012M) Capacitor)
pins: 1, 2

## GCM21BR72A473KA37L_BKN
designator C?  Capacitance: 47nF  (hidden comment: *)
Capacitor, Ceramic (MLCC), 47nF, ±10%, 100V, X7R, ±10%, SMD 0805; Manufacturer: Murata Electronics; Manufacturer Part Number: GCM21BR72A473KA37L/BKN; Package Size: 0805; JLCPCB Basic Part: No; JLCPCB Part Number: C184485; Supplier 1: LCSC; Category: Capacitors - MLCC; Supplier Part Number 1: C184485; Tolerance: ±10%; Voltage Rating: 100V; Temperature Coefficient: X7R; RoHS: Yes; ComponentLink1Description: Datasheet; ComponentLink1URL: https://wmsc.lcsc.com/wmsc/upload/file/pdf/v2/lcsc/2304140030_Murata-Electronics-GCM21BR72A473KA37L-BKN_C184485.pdf; ComponentLink2Description: JLCPCB Part URL; ComponentLink2URL: https://jlcpcb.com/partdetail/C184485; ComponentLink3Description: LCSC Part URL; ComponentLink3URL: https://lcsc.com/product-detail/Multilayer-Ceramic-Capacitors-MLCC---SMD-SMT_Murata-Electronics-Murata-Electronics-GCM21BR72A473KA37L-BKN_C184485.html
footprint CAP-0805 (0805 (2012M) Capacitor)
pins: 1, 2

## GCM21BR91H104KA37L
designator C?  Capacitance: 100nF  (hidden comment: *)
Capacitor, Ceramic (MLCC), 100nF, ±10%, 50V, X8R, ±10%, SMD 0805; Manufacturer: Murata Electronics; Manufacturer Part Number: GCM21BR91H104KA37L; Package Size: 0805; JLCPCB Basic Part: No; JLCPCB Part Number: C161269; Supplier 1: LCSC; Category: Capacitors - MLCC; Supplier Part Number 1: C161269; Tolerance: ±10%; Voltage Rating: 50V; Temperature Coefficient: X8R; RoHS: Yes; ComponentLink1Description: Datasheet; ComponentLink1URL: https://wmsc.lcsc.com/wmsc/upload/file/pdf/v2/lcsc/1810251040_Murata-Electronics-GCM21BR91H104KA37L_C161269.pdf; ComponentLink2Description: JLCPCB Part URL; ComponentLink2URL: https://jlcpcb.com/partdetail/C161269; ComponentLink3Description: LCSC Part URL; ComponentLink3URL: https://lcsc.com/product-detail/Multilayer-Ceramic-Capacitors-MLCC---SMD-SMT_Murata-Electronics-Murata-Electronics-GCM21BR91H104KA37L_C161269.html
footprint CAP-0805 (0805 (2012M) Capacitor)
pins: 1, 2

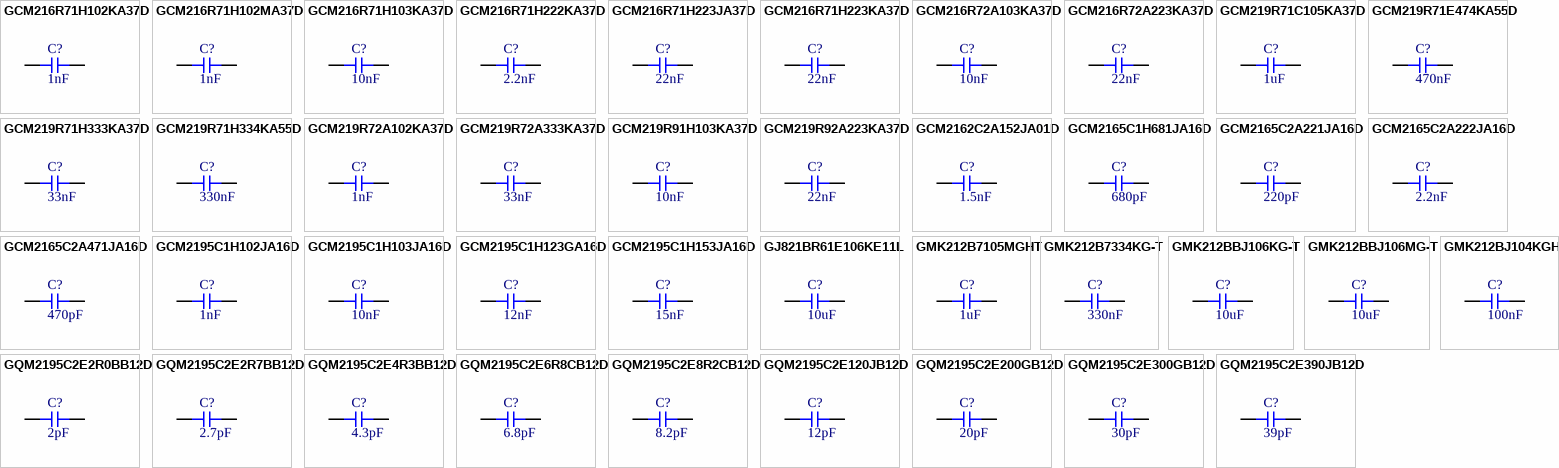
[diagram p63: symbols GCM216R71H102KA37D to GQM2195C2E390JB12D]

## GCM216R71H102KA37D
designator C?  Capacitance: 1nF  (hidden comment: *)
Capacitor, Ceramic (MLCC), 1nF, ±10%, 50V, X7R, ±10%, SMD 0805; Manufacturer: Murata Electronics; Manufacturer Part Number: GCM216R71H102KA37D; Package Size: 0805; JLCPCB Basic Part: No; JLCPCB Part Number: C393693; Supplier 1: LCSC; Category: Capacitors - MLCC; Supplier Part Number 1: C393693; Tolerance: ±10%; Voltage Rating: 50V; Temperature Coefficient: X7R; RoHS: Yes; ComponentLink1Description: Datasheet; ComponentLink1URL: https://wmsc.lcsc.com/wmsc/upload/file/pdf/v2/lcsc/1912111437_Murata-Electronics-GCM216R71H102KA37D_C393693.pdf; ComponentLink2Description: JLCPCB Part URL; ComponentLink2URL: https://jlcpcb.com/partdetail/C393693; ComponentLink3Description: LCSC Part URL; ComponentLink3URL: https://lcsc.com/product-detail/Multilayer-Ceramic-Capacitors-MLCC---SMD-SMT_Murata-Electronics-Murata-Electronics-GCM216R71H102KA37D_C393693.html
footprint CAP-0805 (0805 (2012M) Capacitor)
pins: 1, 2

## GCM216R71H102MA37D
designator C?  Capacitance: 1nF  (hidden comment: *)
Capacitor, Ceramic (MLCC), 1nF, ±20%, 50V, X7R, ±20%, SMD 0805; Manufacturer: Murata Electronics; Manufacturer Part Number: GCM216R71H102MA37D; Package Size: 0805; JLCPCB Basic Part: No; JLCPCB Part Number: C161244; Supplier 1: LCSC; Category: Capacitors - MLCC; Supplier Part Number 1: C161244; Tolerance: ±20%; Voltage Rating: 50V; Temperature Coefficient: X7R; RoHS: Yes; ComponentLink1Description: Datasheet; ComponentLink1URL: https://wmsc.lcsc.com/wmsc/upload/file/pdf/v2/lcsc/2304140030_Murata-Electronics-GCM216R71H102MA37D_C161244.pdf; ComponentLink2Description: JLCPCB Part URL; ComponentLink2URL: https://jlcpcb.com/partdetail/C161244; ComponentLink3Description: LCSC Part URL; ComponentLink3URL: https://lcsc.com/product-detail/Multilayer-Ceramic-Capacitors-MLCC---SMD-SMT_Murata-Electronics-Murata-Electronics-GCM216R71H102MA37D_C161244.html
footprint CAP-0805 (0805 (2012M) Capacitor)
pins: 1, 2

## GCM216R71H103KA37D
designator C?  Capacitance: 10nF  (hidden comment: *)
Capacitor, Ceramic (MLCC), 10nF, ±10%, 50V, X7R, ±10%, SMD 0805; Manufacturer: Murata Electronics; Manufacturer Part Number: GCM216R71H103KA37D; Package Size: 0805; JLCPCB Basic Part: No; JLCPCB Part Number: C388908; Supplier 1: LCSC; Category: Capacitors - MLCC; Supplier Part Number 1: C388908; Tolerance: ±10%; Voltage Rating: 50V; Temperature Coefficient: X7R; RoHS: Yes; ComponentLink1Description: Datasheet; ComponentLink1URL: https://wmsc.lcsc.com/wmsc/upload/file/pdf/v2/lcsc/1912111437_Murata-Electronics-GCM216R71H103KA37D_C388908.pdf; ComponentLink2Description: JLCPCB Part URL; ComponentLink2URL: https://jlcpcb.com/partdetail/C388908; ComponentLink3Description: LCSC Part URL; ComponentLink3URL: https://lcsc.com/product-detail/Multilayer-Ceramic-Capacitors-MLCC---SMD-SMT_Murata-Electronics-Murata-Electronics-GCM216R71H103KA37D_C388908.html
footprint CAP-0805 (0805 (2012M) Capacitor)
pins: 1, 2

## GCM216R71H222KA37D
designator C?  Capacitance: 2.2nF  (hidden comment: *)
Capacitor, Ceramic (MLCC), 2.2nF, ±10%, 50V, X7R, ±10%, SMD 0805; Manufacturer: Murata Electronics; Manufacturer Part Number: GCM216R71H222KA37D; Package Size: 0805; JLCPCB Basic Part: No; JLCPCB Part Number: C437477; Supplier 1: LCSC; Category: Capacitors - MLCC; Supplier Part Number 1: C437477; Tolerance: ±10%; Voltage Rating: 50V; Temperature Coefficient: X7R; RoHS: Yes; ComponentLink1Description: Datasheet; ComponentLink1URL: https://wmsc.lcsc.com/wmsc/upload/file/pdf/v2/lcsc/2304140030_Murata-Electronics-GCM216R71H222KA37D_C437477.pdf; ComponentLink2Description: JLCPCB Part URL; ComponentLink2URL: https://jlcpcb.com/partdetail/C437477; ComponentLink3Description: LCSC Part URL; ComponentLink3URL: https://lcsc.com/product-detail/Multilayer-Ceramic-Capacitors-MLCC---SMD-SMT_Murata-Electronics-Murata-Electronics-GCM216R71H222KA37D_C437477.html
footprint CAP-0805 (0805 (2012M) Capacitor)
pins: 1, 2
